# Altium footprint library 11.Other.PcbLib: 23 footprints (part 2 of 2)
Each footprint in its own frame and in the unit in brackets; x right, y up, seen from the top. Pads: shape width x height; smd on the part's side, far side on the other; paste and mask are expansions set on the pad; w line width, h text height; cw(c..) or ccw(c..) is an arc to the next point about the centre after c.
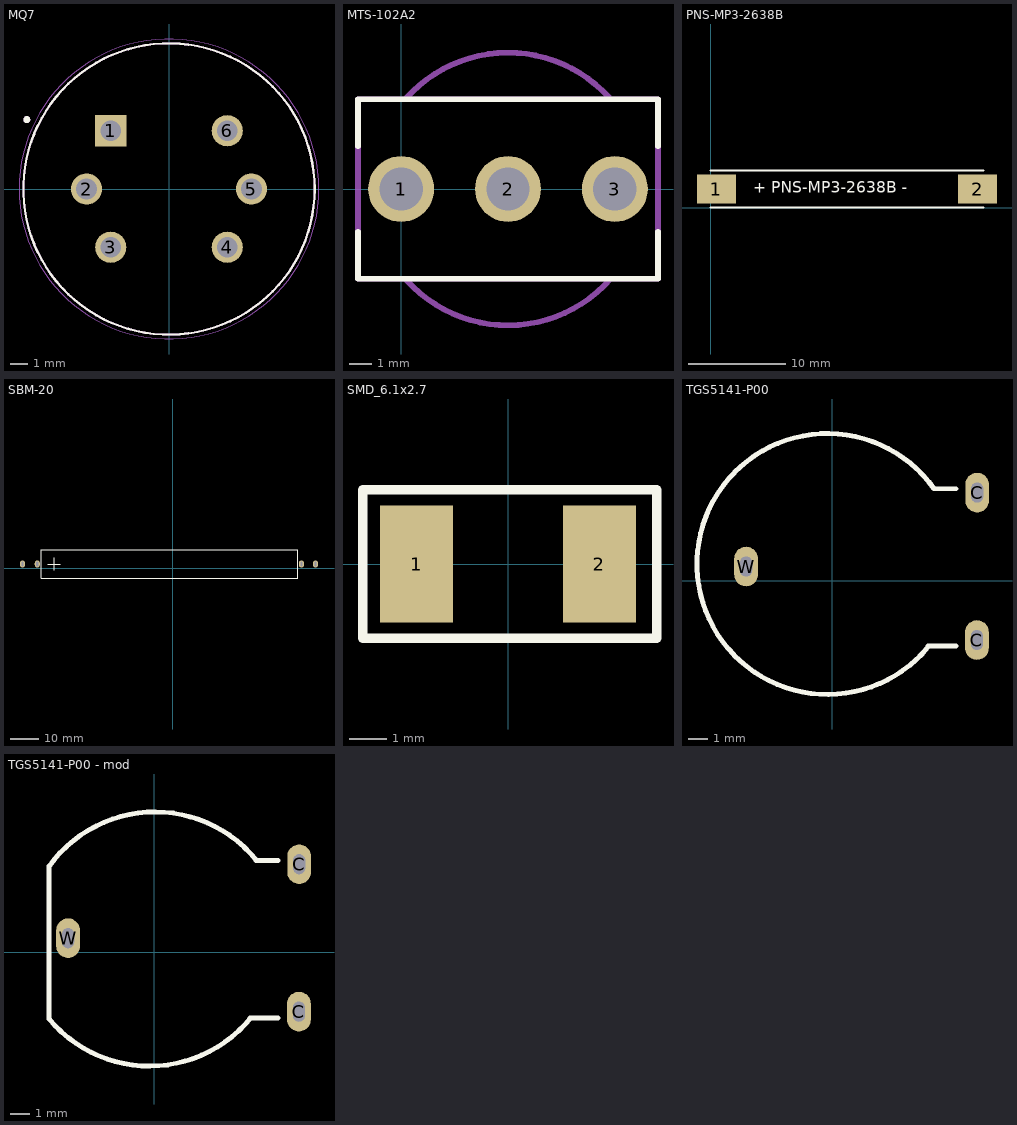
[diagram p1: the footprints below, top view; thin cyan lines are the x and y axes]

## MQ7 [mm]
pads (6):
  rect 1.8x1.8 hole 1.2: 1(-3.359,3.359)
  round 1.8 hole 1.2: 2(-4.75,0) 3(-3.359,-3.359) 4(3.359,-3.359) 5(4.75,0) 6(3.359,3.359)
Top Overlay:
  circle w0.2: c-8.2,4 r0.1
  circle w0.127: c0,0 r8.4
Mechanical 13:
  circle w0.2: c-8.2,4 r0.1
  circle w0.127: c0,0 r8.4
Mechanical 15:
  circle w0.05: c0,0 r8.65
3D body "mq-7.stp": height 9.2, standoff -7.3, extent -8.375,-8.388 8.425,8.388

## MTS-102A2 [mm]
height 31
pads (3):
  round 2.9 hole 1.9: 1(0,0) 2(4.7,0) 3(9.4,0)
Top Overlay:
  lines w0.25: -1.9,-1.875 -1.9,-3.95 11.3,-3.95 11.3,-1.875 ; -1.9,1.875 -1.9,3.95 11.3,3.95 11.3,1.875
Mechanical 1:
  lines w0.25: 0.205,3.974 cw(c4.7,0) 9.159,4.015 ; 0.224,-3.996 ccw(c4.7,0) 9.22,-3.946 ; -1.9,-3.95 -1.9,3.95 11.3,3.95 11.3,-3.95 -1.9,-3.95 ; -0.625,-0.625 -0.625,0.625 0.625,0.625 0.625,-0.625 -0.625,-0.625
3D body: height 30.9, standoff -4.8, extent -1.9,-5.5 11.3,5.5

## PNS-MP3-2638B [mm]
pads (2):
  rect 4x3 smd: 1(0.6,1.9) 2(27.4,1.9)
Top Overlay:
  lines w0.2: 0,0 28,0 ; 0,3.8 28,3.8
  text "+ PNS-MP3-2638B -" at 4.4,1.1 h2
3D body: height 1, standoff 0.3, extent 0.1,0 28,3.8

## SBM-20 [mm]
pads (4):
  oval 1.8x2.5 hole 1.5 slot 0.6 at 0 deg: 1(-53.5,1.5) 1(-48.25,1.5) 2(45.75,1.5) 2(50.75,1.5)
Top Overlay:
  lines w0.2: -44.5,1.5 -40,1.5 ; -42.25,-0.75 -42.25,3.75 ; -46.75,-3.5 44.5,-3.5 44.5,6.5 -46.75,6.5 -46.75,-3.5
3D body "SBM20GMtube.stp": height 13.45, standoff 2.82, extent -55,-3.823 51.908,6.823
3D body "User Library-FUSECLIP.step": height 10.92, standoff -3.5, extent -53.802,-2.366 -48.198,5.366
3D body "User Library-FUSECLIP.step": height 10.92, standoff -3.5, extent 45.396,-2.366 51,5.366

## SMD_6.1x2.7 [mm]
pads (2):
  rect 1.96x3.15 smd: 1(-2.455,0) 2(2.455,0)
Top Overlay:
  lines w0.254: -3.9,-2 -3.9,2 4,2 4,-2 -3.9,-2
3D body: height 3.81, standoff 0.2, extent -3.05,-1.35 3.05,1.35

## TGS5141-P00 [mm]
pads (3):
  oval 1.2x2 hole 0.6 slot 1 at 90 deg: C(7.312,-2.987) C(7.324,4.457) W(-4.345,0.723)
Top Overlay:
  lines w0.25: 4.85,-3.3 6.25,-3.3 ; 4.852,-3.332 cw(c-0.236,0.851) 5.145,4.65 ; 5.15,4.65 6.25,4.65
3D body "User Library-TGS5141.step": height 7.2, standoff -3.6, extent -7.219,-6.225 7.419,7.675

## TGS5141-P00 - mod [mm]
pads (3):
  oval 1.2x2 hole 0.6 slot 1 at 90 deg: C(7.312,-2.987) C(7.324,4.457) W(-4.345,0.723)
Top Overlay:
  lines w0.25: -5.3,-3.35 -5.3,4.375 ; -5.294,-3.37 ccw(c-0.236,0.851) 4.867,-3.314 ; -5.292,4.369 cw(c0.047,0.51) 5.15,4.675 ; 4.85,-3.3 6.25,-3.3 ; 5.15,4.65 6.25,4.65
3D body "User Library-TGS5141.step": height 7.2, standoff -3.6, extent -7.219,-6.225 7.419,7.675